# Altium footprint library 6-Connectors-2.PcbLib: 57 footprints (part 6 of 7)
Each footprint in its own frame and in the unit in brackets; x right, y up, seen from the top. Pads: shape width x height; smd on the part's side, far side on the other; paste and mask are expansions set on the pad; w line width, h text height; cw(c..) or ccw(c..) is an arc to the next point about the centre after c.
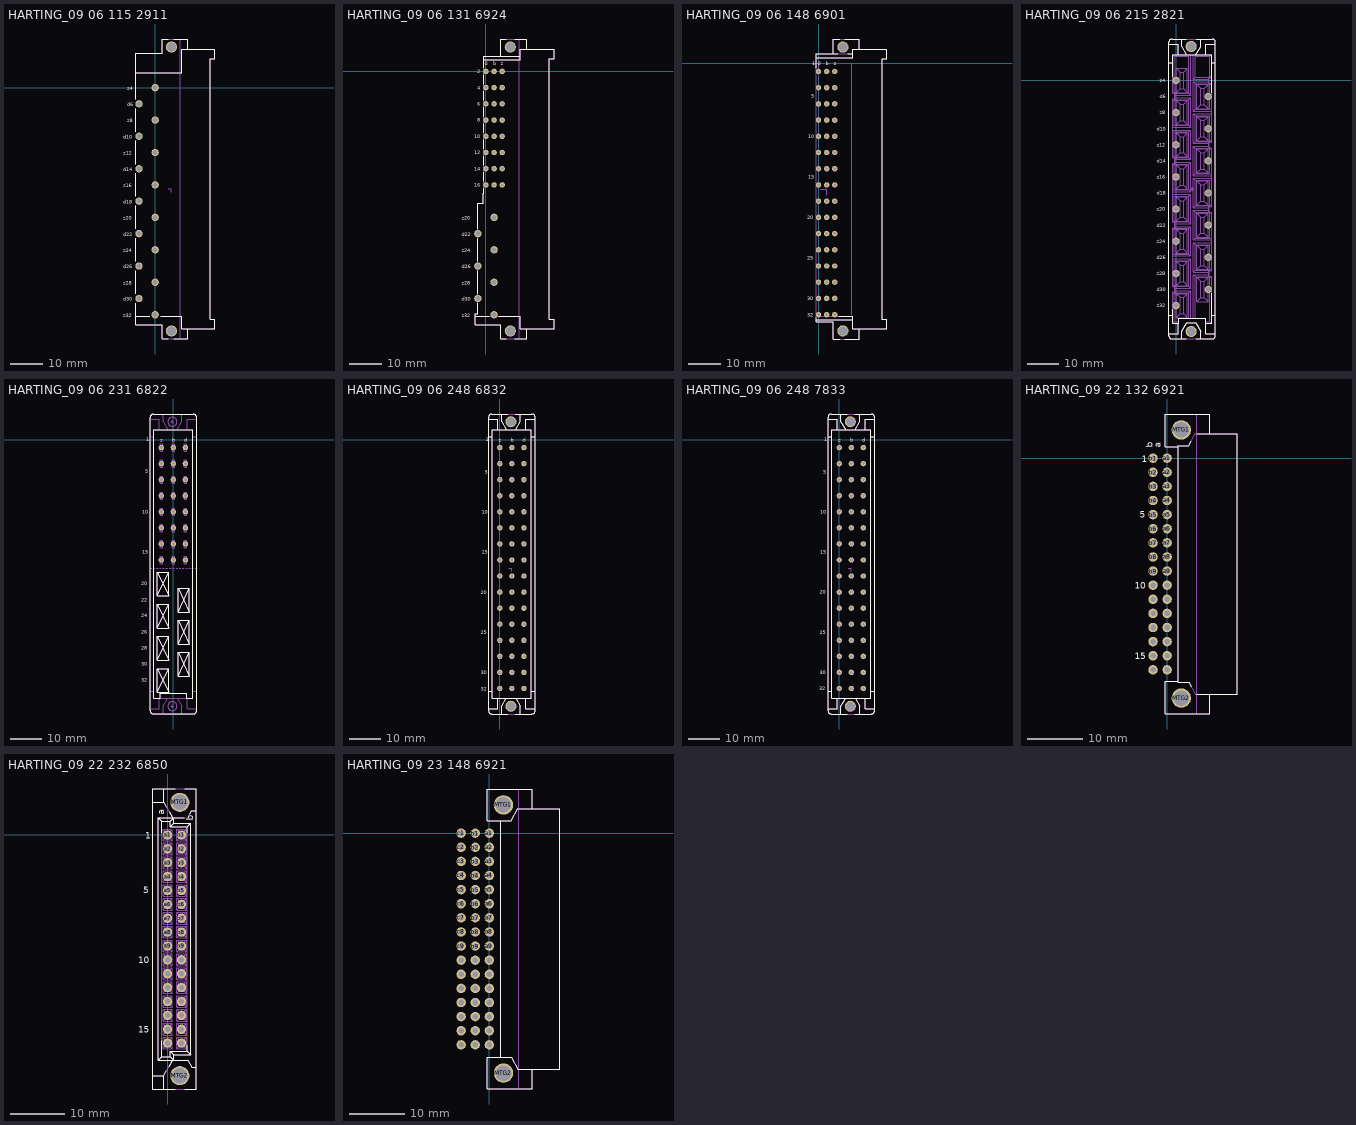
[diagram p5: the footprints below, top view; thin cyan lines are the x and y axes]

## HARTING_09 06 115 2911 [mm] "DIN 41612, Type H, 15 Poles, Rows z+d, Performance level 1, Right Angle Male Connector, Lead 3.0 mm, Pitch 5.08mm"
height 11
pads (17):
  round 2.3 hole 1.6: d6(-5.08,-5.08) d10(-5.08,-15.24) d14(-5.08,-25.4) d18(-5.08,-35.56) d22(-5.08,-45.72) d26(-5.08,-55.88) d30(-5.08,-66.04) z4(0,0) z8(0,-10.16) z12(0,-20.32) z16(0,-30.48) z20(0,-40.64) z24(0,-50.8) z28(0,-60.96) z32(0,-71.12)
  round 3.5 / inner round 3.5 / far side round 5.1 hole 2.8: MTG1(5.08,12.7) MTG2(5.08,-76.2)
Top Overlay:
  lines w0.2: -6.02,-71.55 -1.696,-71.55 ; -6.02,-67.516 -6.02,-74.3 2.18,-74.3 2.18,-78.725 4.14,-78.725 ; -6.02,-64.564 -6.02,-57.356 ; -6.02,-54.404 -6.02,-47.196 ; -6.02,-44.244 -6.02,-37.036 ; -6.02,-34.084 -6.02,-26.876 ; -6.02,-23.924 -6.02,-16.716 ; -6.02,-13.764 -6.02,-6.556 ; -6.02,-3.604 -6.02,10.8 2.18,10.8 2.18,15.225 4.14,15.225 ; -6.02,4.67 8.38,4.67 8.38,11.95 18.73,11.95 18.73,9.05 17.21,9.05 17.21,-72.55 18.73,-72.55 18.73,-75.45 8.38,-75.45 8.38,-71.55 1.696,-71.55 ; 5.765,-78.725 10.23,-78.725 10.23,-75.45 ; 5.765,15.225 10.23,15.225 10.23,11.95
  text "z32" at -10.07,-71.87 h1.2
  text "z28" at -10.07,-61.71 h1.2
  text "d30" at -10.07,-66.79 h1.2
  text "z24" at -10.07,-51.55 h1.2
  text "d26" at -10.07,-56.63 h1.2
  text "z20" at -10.07,-41.39 h1.2
  text "d22" at -10.07,-46.47 h1.2
  text "z16" at -10.07,-31.23 h1.2
  text "d18" at -10.07,-36.31 h1.2
  text "z12" at -10.07,-21.07 h1.2
  text "d14" at -10.07,-26.15 h1.2
  text "z8" at -8.8,-10.91 h1.2
  text "d10" at -10.07,-15.99 h1.2
  text "d6" at -8.8,-5.83 h1.2
  text "z4" at -8.8,-0.75 h1.2
Mechanical 8:
  lines w0.2: 4.064,-31.75 5.08,-31.75 5.08,-32.75 ; 7.84,-78.725 7.84,15.225
  text "PCB" at 6.985,-33.655 h1.2
Mechanical 14:
  lines w0.1: -6.02,-71.55 -1.696,-71.55 ; -6.02,-67.516 -6.02,-74.3 2.18,-74.3 2.18,-78.725 10.23,-78.725 10.23,-75.45 ; -6.02,-64.564 -6.02,-57.356 ; -6.02,-54.404 -6.02,-47.196 ; -6.02,-44.244 -6.02,-37.036 ; -6.02,-34.084 -6.02,-26.876 ; -6.02,-23.924 -6.02,-16.716 ; -6.02,-13.764 -6.02,-6.556 ; -6.02,-3.604 -6.02,10.8 2.18,10.8 2.18,15.225 10.23,15.225 10.23,11.95 ; -6.02,4.67 8.38,4.67 8.38,11.95 18.73,11.95 18.73,9.05 17.21,9.05 17.21,-72.55 18.73,-72.55 18.73,-75.45 8.38,-75.45 8.38,-71.55 1.696,-71.55
  text "z32" at -10.07,-71.87 h1.2
  text "z28" at -10.07,-61.71 h1.2
  text "d30" at -10.07,-66.79 h1.2
  text "z24" at -10.07,-51.55 h1.2
  text "d26" at -10.07,-56.63 h1.2
  text "z20" at -10.07,-41.39 h1.2
  text "d22" at -10.07,-46.47 h1.2
  text "z16" at -10.07,-31.23 h1.2
  text "d18" at -10.07,-36.31 h1.2
  text "z12" at -10.07,-21.07 h1.2
  text "d14" at -10.07,-26.15 h1.2
  text "z8" at -8.8,-10.91 h1.2
  text "d10" at -10.07,-15.99 h1.2
  text "d6" at -8.8,-5.83 h1.2
  text "z4" at -8.8,-0.75 h1.2
3D body "v240-170.stp": height 0.02, standoff -1.65, extent -6.28,-67.24 -3.88,-64.84
3D body "v240-170.stp": height 0.02, standoff -1.65, extent -1.2,-62.16 1.2,-59.76
3D body "v240-170.stp": height 0.02, standoff -1.65, extent -1.2,-72.32 1.2,-69.92
3D body "v240-170.stp": height 0.02, standoff -1.65, extent -1.2,-41.84 1.2,-39.44
3D body "v240-170.stp": height 0.02, standoff -1.65, extent -1.2,-52 1.2,-49.6
3D body "v240-170.stp": height 0.02, standoff -1.65, extent -6.28,-46.92 -3.88,-44.52
3D body "v240-170.stp": height 0.02, standoff -1.65, extent -6.28,-57.08 -3.88,-54.68
3D body "v240-170.stp": height 0.02, standoff -1.65, extent -1.2,-21.52 1.2,-19.12
3D body "v240-170.stp": height 0.02, standoff -1.65, extent -1.2,-31.68 1.2,-29.28
3D body "v240-170.stp": height 0.02, standoff -1.65, extent -6.28,-26.6 -3.88,-24.2
3D body "v240-170.stp": height 0.02, standoff -1.65, extent -6.28,-36.76 -3.88,-34.36
3D body "v240-170.stp": height 0.02, standoff -1.65, extent -1.2,-1.2 1.2,1.2
3D body "v240-170.stp": height 0.02, standoff -1.65, extent -1.2,-11.36 1.2,-8.96
3D body "v240-170.stp": height 0.02, standoff -1.65, extent -6.28,-6.28 -3.88,-3.88
3D body "v240-170.stp": height 0.02, standoff -1.65, extent -6.28,-16.44 -3.88,-14.04
3D body "v160-080.stp": height 0.02, standoff -1.65, extent -5.88,-16.04 -4.28,-14.44
3D body "v160-080.stp": height 0.02, standoff -1.65, extent -5.88,-5.88 -4.28,-4.28
3D body "HARTING_09 06 115 2911.stp": height 11.2, standoff -3.5, extent -6.02,-78.725 18.73,15.225

## HARTING_09 06 131 6924 [mm] "DIN 41612, Type MH, 24+ 7 Contacts, Rows z+b+d, Performance level 2, Right Angled Male Connector"
height 11.22
pads (33):
  round 1.7 hole 1: b2(2.54,0) b4(2.54,-5.08) b6(2.54,-10.16) b8(2.54,-15.24) b10(2.54,-20.32) b12(2.54,-25.4) b14(2.54,-30.48) b16(2.54,-35.56) d2(0,0) d4(0,-5.08) d6(0,-10.16) d8(0,-15.24) d10(0,-20.32) d12(0,-25.4) d14(0,-30.48) d16(0,-35.56) z2(5.08,0) z4(5.08,-5.08) z6(5.08,-10.16) z8(5.08,-15.24) z10(5.08,-20.32) z12(5.08,-25.4) z14(5.08,-30.48) z16(5.08,-35.56)
  round 2.3 hole 1.6: d22(-2.54,-50.8) d26(-2.54,-60.96) d30(-2.54,-71.12) z20(2.54,-45.72) z24(2.54,-55.88) z28(2.54,-66.04) z32(2.54,-76.2)
  round 3.5 / inner round 3.5 / far side round 5.1 hole 2.8: MTG1(7.62,7.62) MTG2(7.62,-81.28)
Top Overlay:
  lines w0.2: -3.43,-76.63 1.051,-76.63 ; -2.63,-72.667 -2.63,-75.83 -3.43,-75.83 -3.43,-79.36 4.67,-79.36 4.67,-83.805 6.325,-83.805 ; -2.63,-69.573 -2.63,-62.507 ; -2.63,-59.413 -2.63,-52.347 ; -2.63,-49.253 -2.63,-41.345 -0.83,-41.345 -0.83,-38.1 -0.68,-38.1 -0.68,-36.668 ; -0.68,-34.452 -0.68,-31.588 ; -0.68,-29.372 -0.68,-26.508 ; -0.68,-24.292 -0.68,-21.428 ; -0.68,-19.212 -0.68,-16.348 ; -0.68,-14.132 -0.68,-11.268 ; -0.68,-9.052 -0.68,-6.188 ; -0.68,-3.972 -0.68,-1.108 ; -0.68,1.108 -0.68,4.79 10.77,4.79 ; -0.68,3.62 10.77,3.62 10.77,6.87 21.32,6.87 21.32,3.97 19.82,3.97 19.82,-77.63 21.32,-77.63 21.32,-80.53 10.77,-80.53 ; 4.029,-76.63 10.77,-76.63 ; 4.67,4.79 4.67,10.145 6.325,10.145 ; 9.025,-83.805 12.77,-83.805 12.77,-80.53 ; 9.025,10.145 12.77,10.145 12.77,6.87 ; 10.77,-80.53 10.77,-76.63 ; 10.77,-80.53 10.77,-76.63
  text "d22" at -7.53,-51.55 h1.2
  text "z20" at -7.53,-46.47 h1.2
  text "d26" at -7.53,-61.71 h1.2
  text "z24" at -7.53,-56.63 h1.2
  text "d30" at -7.53,-71.87 h1.2
  text "z28" at -7.53,-66.79 h1.2
  text "z32" at -7.53,-76.95 h1.2
  text "b" at 2.223,1.905 h1.2
  text "2" at -2.765,-0.543 h1.2
  text "4" at -2.79,-5.685 h1.2
  text "z" at 4.608,1.905 h1.2
  text "d" at -0.318,1.905 h1.2
  text "6" at -2.79,-10.765 h1.2
  text "8" at -2.79,-15.845 h1.2
  text "10" at -3.74,-20.925 h1.2
  text "12" at -3.74,-26.005 h1.2
  text "14" at -3.74,-31.085 h1.2
  text "16" at -3.74,-36.165 h1.2
Mechanical 8:
  lines w0.1: -3.04,-71.12 -2.54,-71.12 ; -3.04,-60.96 -2.54,-60.96 ; -3.04,-50.8 -2.54,-50.8 ; -2.54,-71.62 -2.54,-71.12 ; -2.54,-70.62 -2.54,-71.12 ; -2.54,-61.46 -2.54,-60.96 ; -2.54,-60.46 -2.54,-60.96 ; -2.54,-51.3 -2.54,-50.8 ; -2.54,-50.3 -2.54,-50.8 ; -2.04,-71.12 -2.54,-71.12 ; -2.04,-60.96 -2.54,-60.96 ; -2.04,-50.8 -2.54,-50.8 ; -0.5,-35.56 0,-35.56 ; -0.5,-30.48 0,-30.48 ; -0.5,-25.4 0,-25.4 ; -0.5,-20.32 0,-20.32 ; -0.5,-15.24 0,-15.24 ; -0.5,-10.16 0,-10.16 ; -0.5,-5.08 0,-5.08 ; 0,-36.06 0,-35.56 ; 0,-35.06 0,-35.56 ; 0,-30.98 0,-30.48 ; 0,-29.98 0,-30.48 ; 0,-25.9 0,-25.4 ; 0,-24.9 0,-25.4 ; 0,-20.82 0,-20.32 ; 0,-19.82 0,-20.32 ; 0,-15.74 0,-15.24 ; 0,-14.74 0,-15.24 ; 0,-10.66 0,-10.16 ; 0,-9.66 0,-10.16 ; 0,-5.58 0,-5.08 ; 0,-4.58 0,-5.08 ; 0.5,-35.56 0,-35.56 ; 0.5,-30.48 0,-30.48 ; 0.5,-25.4 0,-25.4 ; 0.5,-20.32 0,-20.32 ; 0.5,-15.24 0,-15.24 ; 0.5,-10.16 0,-10.16 ; 0.5,-5.08 0,-5.08 ; 2.04,-76.2 2.54,-76.2 ; 2.04,-66.04 2.54,-66.04 ; 2.04,-55.88 2.54,-55.88 ; 2.04,-45.72 2.54,-45.72 ; 2.04,-35.56 2.54,-35.56 ; 2.04,-30.48 2.54,-30.48 ; 2.04,-25.4 2.54,-25.4 ; 2.04,-20.32 2.54,-20.32 ; 2.04,-15.24 2.54,-15.24 ; 2.04,-10.16 2.54,-10.16 ; 2.04,-5.08 2.54,-5.08 ; 2.04,0 2.54,0 ; 2.54,-76.7 2.54,-76.2 ; 2.54,-75.7 2.54,-76.2 ; 2.54,-66.54 2.54,-66.04 ; 2.54,-65.54 2.54,-66.04 ; 2.54,-56.38 2.54,-55.88 ; 2.54,-55.38 2.54,-55.88 ; 2.54,-46.22 2.54,-45.72 ; 2.54,-45.22 2.54,-45.72 ; 2.54,-36.06 2.54,-35.56 ; 2.54,-35.06 2.54,-35.56 ; 2.54,-30.98 2.54,-30.48 ; 2.54,-29.98 2.54,-30.48 ; 2.54,-25.9 2.54,-25.4 ; 2.54,-24.9 2.54,-25.4 ; 2.54,-20.82 2.54,-20.32 ; 2.54,-19.82 2.54,-20.32 ; 2.54,-15.74 2.54,-15.24 ; 2.54,-14.74 2.54,-15.24 ; 2.54,-10.66 2.54,-10.16 ; 2.54,-9.66 2.54,-10.16 ; 2.54,-5.58 2.54,-5.08 ; 2.54,-4.58 2.54,-5.08 ; 2.54,-0.5 2.54,0 ; 2.54,0.5 2.54,0 ; 3.04,-76.2 2.54,-76.2 ; 3.04,-66.04 2.54,-66.04 ; 3.04,-55.88 2.54,-55.88 ; 3.04,-45.72 2.54,-45.72 ; 3.04,-35.56 2.54,-35.56 ; 3.04,-30.48 2.54,-30.48 ; 3.04,-25.4 2.54,-25.4 ; 3.04,-20.32 2.54,-20.32 ; 3.04,-15.24 2.54,-15.24 ; 3.04,-10.16 2.54,-10.16 ; 3.04,-5.08 2.54,-5.08 ; 3.04,0 2.54,0 ; 4.58,-35.56 5.08,-35.56 ; 4.58,-30.48 5.08,-30.48 ; 4.58,-25.4 5.08,-25.4 ; 4.58,-20.32 5.08,-20.32 ; 4.58,-15.24 5.08,-15.24 ; 4.58,-10.16 5.08,-10.16 ; 4.58,-5.08 5.08,-5.08 ; 4.58,0 5.08,0 ; 5.08,-36.06 5.08,-35.56 ; 5.08,-35.06 5.08,-35.56 ; 5.08,-30.98 5.08,-30.48 ; 5.08,-29.98 5.08,-30.48 ; 5.08,-25.9 5.08,-25.4 ; 5.08,-24.9 5.08,-25.4 ; 5.08,-20.82 5.08,-20.32 ; 5.08,-19.82 5.08,-20.32 ; 5.08,-15.74 5.08,-15.24 ; 5.08,-14.74 5.08,-15.24 ; 5.08,-10.66 5.08,-10.16 ; 5.08,-9.66 5.08,-10.16 ; 5.08,-5.58 5.08,-5.08 ; 5.08,-4.58 5.08,-5.08 ; 5.08,-0.5 5.08,0 ; 5.08,0.5 5.08,0 ; 5.58,-35.56 5.08,-35.56 ; 5.58,-30.48 5.08,-30.48 ; 5.58,-25.4 5.08,-25.4 ; 5.58,-20.32 5.08,-20.32 ; 5.58,-15.24 5.08,-15.24 ; 5.58,-10.16 5.08,-10.16 ; 5.58,-5.08 5.08,-5.08 ; 5.58,0 5.08,0 ; 7.12,-81.28 7.62,-81.28 ; 7.12,7.62 7.62,7.62 ; 7.62,-81.78 7.62,-81.28 ; 7.62,-80.78 7.62,-81.28 ; 7.62,7.12 7.62,7.62 ; 7.62,8.12 7.62,7.62 ; 8.12,-81.28 7.62,-81.28 ; 8.12,7.62 7.62,7.62 ; 10.38,-83.805 10.38,-36.83 10.38,10.145 ; 0,0 0,-0.5 0,0 ; 0,0 -0.5,0 0,0 ; 0,0 0,0.5 0,0 ; 0,0 0.5,0 0,0
  text "PCB Edge" at 9.525,-38.735 h1.2
Mechanical 14:
  circle w0.1: c7.62,7.62 r1.29
  circle w0.1: c7.62,-81.28 r1.29
  lines w0.1: -3.43,-76.63 10.77,-76.63 ; -0.68,3.62 10.77,3.62 10.77,6.87 21.32,6.87 21.32,3.97 19.82,3.97 19.82,-77.63 21.32,-77.63 21.32,-80.53 10.77,-80.53 ; 4.67,4.79 4.67,10.145 12.77,10.145 12.77,6.87 ; 10.77,4.79 -0.68,4.79 -0.68,-38.1 -0.83,-38.1 -0.83,-41.345 -2.63,-41.345 -2.63,-75.83 -3.43,-75.83 -3.43,-79.36 4.67,-79.36 4.67,-83.805 12.77,-83.805 12.77,-80.53 ; 10.77,-80.53 10.77,-76.63 ; 10.77,-80.53 10.77,-76.63
  text "d22" at -7.53,-51.55 h1.2
  text "z20" at -7.53,-46.47 h1.2
  text "d26" at -7.53,-61.71 h1.2
  text "z24" at -7.53,-56.63 h1.2
  text "d30" at -7.53,-71.87 h1.2
  text "z28" at -7.53,-66.79 h1.2
  text "z32" at -7.53,-76.95 h1.2
  text "b" at 2.223,1.905 h1.2
  text "2" at -2.765,-0.543 h1.2
  text "4" at -2.79,-5.685 h1.2
  text "z" at 4.608,1.905 h1.2
  text "d" at -0.318,1.905 h1.2
  text "6" at -2.79,-10.765 h1.2
  text "8" at -2.79,-15.845 h1.2
  text "10" at -3.74,-20.925 h1.2
  text "12" at -3.74,-26.005 h1.2
  text "14" at -3.74,-31.085 h1.2
  text "16" at -3.74,-36.165 h1.2
3D body "HARTING_09 06 131 6924.stp": height 11.22, standoff -3.48, extent -3.43,-83.805 21.32,10.145

## HARTING_09 06 148 6901 [mm] "DIN 41612, Type F, 48 Contacts, Rows z+b+d, Performance level 2, Right Angle Male Connector"
height 10.1
pads (50):
  round 1.7 hole 1: b2(2.54,-2.54) b4(2.54,-7.62) b6(2.54,-12.7) b8(2.54,-17.78) b10(2.54,-22.86) b12(2.54,-27.94) b14(2.54,-33.02) b16(2.54,-38.1) b18(2.54,-43.18) b20(2.54,-48.26) b22(2.54,-53.34) b24(2.54,-58.42) b26(2.54,-63.5) b28(2.54,-68.58) b30(2.54,-73.66) b32(2.54,-78.74) d2(0,-2.54) d4(0,-7.62) d6(0,-12.7) d8(0,-17.78) d10(0,-22.86) d12(0,-27.94) d14(0,-33.02) d16(0,-38.1) d18(0,-43.18) d20(0,-48.26) d22(0,-53.34) d24(0,-58.42) d26(0,-63.5) d28(0,-68.58) d30(0,-73.66) d32(0,-78.74) z2(5.08,-2.54) z4(5.08,-7.62) z6(5.08,-12.7) z8(5.08,-17.78) z10(5.08,-22.86) z12(5.08,-27.94) z14(5.08,-33.02) z16(5.08,-38.1) z18(5.08,-43.18) z20(5.08,-48.26) z22(5.08,-53.34) z24(5.08,-58.42) z26(5.08,-63.5) z28(5.08,-68.58) z30(5.08,-73.66) z32(5.08,-78.74)
  round 3.5 / inner round 3.5 / far side round 5.1 hole 2.8: MTG1(7.62,5.08) MTG2(7.62,-83.82)
Top Overlay:
  lines w0.2: -0.78,-80.29 10.8,-80.29 ; -0.78,-79.742 -0.78,-80.97 4.67,-80.97 4.67,-86.37 6.63,-86.37 ; -0.78,-1.538 -0.78,2.95 6,2.95 ; -0.78,1.83 10.8,1.83 10.8,4.38 21.32,4.38 21.32,1.48 19.82,1.48 19.82,-80.22 21.32,-80.22 21.32,-83.12 10.8,-83.12 10.8,-79.17 6.275,-79.17 ; 4.67,2.95 4.67,7.63 6.63,7.63 ; 8.255,-86.37 12.72,-86.37 ; 8.255,7.63 12.72,7.63 ; 9.2,2.95 10.8,2.95 ; 12.77,-86.37 12.77,-83.12 ; 12.77,4.38 12.77,7.63
  text "d" at -0.318,-0.635 h1.2
  text "1" at -1.89,-0.635 h1.2
  text "z" at 4.763,-0.635 h1.2
  text "b" at 2.222,-0.635 h1.2
  text "32" at -3.477,-79.375 h1.2
  text "10" at -3.16,-23.495 h1.2
  text "15" at -3.16,-36.195 h1.2
  text "20" at -3.477,-48.895 h1.2
  text "25" at -3.477,-61.595 h1.2
  text "30" at -3.477,-74.295 h1.2
  text "5" at -2.207,-10.795 h1.2
Mechanical 8:
  lines w0.1: -2,0 0,0 0,-2 ; -0.78,-77.738 -0.78,-74.662 ; -0.78,-72.658 -0.78,-69.582 ; -0.78,-67.578 -0.78,-64.502 ; -0.78,-62.498 -0.78,-59.422 ; -0.78,-57.418 -0.78,-54.355 ; -0.78,-52.326 -0.78,-49.262 ; -0.78,-47.258 -0.78,-44.182 ; -0.78,-42.178 -0.78,-39.102 ; -0.78,-37.098 -0.78,-34.022 ; -0.78,-32.018 -0.78,-28.942 ; -0.78,-26.938 -0.78,-23.862 ; -0.78,-21.858 -0.78,-18.782 ; -0.78,-16.778 -0.78,-13.702 ; -0.78,-11.698 -0.78,-8.622 ; -0.78,-6.618 -0.78,-3.542 ; 0.54,-39.37 2.54,-39.37 2.54,-41.37 ; 10.38,-78.74 10.38,0
Mechanical 14:
  lines w0.1: -0.78,-80.29 10.8,-80.29 ; -0.78,-79.17 10.8,-79.17 10.8,-83.12 21.32,-83.12 21.32,-80.22 19.82,-80.22 19.82,1.48 21.32,1.48 21.32,4.38 10.8,4.38 10.8,1.83 -0.78,1.83 ; 4.67,2.95 4.67,7.63 12.77,7.63 12.77,4.38 ; 10.8,2.95 -0.78,2.95 -0.78,-80.97 4.67,-80.97 4.67,-86.37 12.77,-86.37 12.77,-83.12
  text "5" at -2.207,-10.795 h1.2
  text "30" at -3.477,-74.295 h1.2
  text "25" at -3.477,-61.595 h1.2
  text "20" at -3.477,-48.895 h1.2
  text "15" at -3.16,-36.195 h1.2
  text "10" at -3.16,-23.495 h1.2
  text "32" at -3.477,-79.375 h1.2
  text "1" at -1.89,-0.635 h1.2
3D body "HARTING_09 06 148 6901.stp": height 11.25, standoff -3.55, extent -0.78,-86.37 21.32,7.63

## HARTING_09 06 215 2821 [mm] "DIN 41612, Type H, 15 Poles, Rows z+d, Performance level 1, Low Profile Straight Female Connector, Lead 4.0 mm, Pitch 5.08mm"
height 10.1
pads (17):
  round 2.3 hole 1.6: d6(10.16,-5.08) d10(10.16,-15.24) d14(10.16,-25.4) d18(10.16,-35.56) d22(10.16,-45.72) d26(10.16,-55.88) d30(10.16,-66.04) z4(0,0) z8(0,-10.16) z12(0,-20.32) z16(0,-30.48) z20(0,-40.64) z24(0,-50.8) z28(0,-60.96) z32(0,-71.12)
  round 3.5 / inner round 3.5 / far side round 5.1 hole 2.8: MTG1(4.78,10.71) MTG2(4.78,-79.29)
Top Overlay:
  lines w0.2: -1.105,-74.24 -2.27,-74.24 ; -1.105,-72.277 -1.105,-76.7 0.855,-76.7 0.855,-76.15 0.855,-75.13 9.305,-75.13 9.305,-76.15 9.305,-76.7 11.265,-76.7 11.265,-67.197 ; -1.105,1.157 -1.105,8.12 11.265,8.12 11.265,-3.923 ; -1.105,5.66 -2.27,5.66 ; 0.705,-76.7 0.705,-80.04 -2.27,-80.04 ; 0.705,8.12 0.705,11.46 -2.27,11.46 ; 3.175,-81.665 1.805,-81.665 ; 3.175,13.085 1.805,13.085 ; 3.3,8.12 1.805,10.71 1.805,13.085 ; 6.26,8.12 7.755,10.71 7.755,13.085 ; 6.385,-81.665 7.755,-81.665 ; 6.385,13.085 7.755,13.085 ; 9.455,-76.7 9.455,-80.04 12.43,-80.04 ; 9.455,8.12 9.455,11.46 12.43,11.46 ; 11.265,-74.24 12.43,-74.24 ; 11.265,5.66 12.43,5.66 ; -2.27,-80.04 -2.27,-74.24 ; -2.27,-80.04 -2.27,-80.665 ccw(c-1.27,-80.665) -1.27,-81.665 1.805,-81.665 ; -2.27,-74.24 -2.27,5.66 ; -2.27,5.66 -2.27,11.46 ; -2.27,11.46 -2.27,12.085 cw(c-1.27,12.085) -1.27,13.085 1.805,13.085 ; 1.805,-81.665 1.805,-79.29 3.378,-76.565 6.182,-76.565 7.755,-79.29 7.755,-81.665 ; 7.755,-81.665 11.43,-81.665 ccw(c11.43,-80.665) 12.43,-80.665 12.43,-80.04 ; 7.755,13.085 11.43,13.085 cw(c11.43,12.085) 12.43,12.085 12.43,11.46 ; 12.43,-80.04 12.43,-74.24 ; 12.43,-74.24 12.43,5.66 ; 12.43,5.66 12.43,11.46
  text "z32" at -6.02,-71.695 h1.2
  text "z28" at -6.02,-61.535 h1.2
  text "d30" at -6.02,-66.615 h1.2
  text "z24" at -6.02,-51.375 h1.2
  text "d26" at -6.145,-56.455 h1.2
  text "z20" at -6.02,-41.215 h1.2
  text "d22" at -6.02,-46.295 h1.2
  text "z16" at -6.02,-31.055 h1.2
  text "d18" at -6.02,-36.135 h1.2
  text "z12" at -6.02,-20.895 h1.2
  text "d14" at -6.02,-25.975 h1.2
  text "z8" at -5.125,-10.685 h1.2
  text "d10" at -6.02,-15.815 h1.2
  text "d6" at -5.125,-5.605 h1.2
  text "z4" at -5.125,-0.525 h1.2
Mechanical 8:
  lines w0.1: -0.5,-71.12 0,-71.12 ; -0.5,-60.96 0,-60.96 ; -0.5,-50.8 0,-50.8 ; -0.5,-40.64 0,-40.64 ; -0.5,-30.48 0,-30.48 ; -0.5,-20.32 0,-20.32 ; -0.5,-10.16 0,-10.16 ; -0.5,0 0,0 ; 0,-71.62 0,-71.12 ; 0,-70.62 0,-71.12 ; 0,-61.46 0,-60.96 ; 0,-60.46 0,-60.96 ; 0,-51.3 0,-50.8 ; 0,-50.3 0,-50.8 ; 0,-41.14 0,-40.64 ; 0,-40.14 0,-40.64 ; 0,-30.98 0,-30.48 ; 0,-29.98 0,-30.48 ; 0,-20.82 0,-20.32 ; 0,-19.82 0,-20.32 ; 0,-10.66 0,-10.16 ; 0,-9.66 0,-10.16 ; 0,-0.5 0,0 ; 0,0.5 0,0 ; 0.5,-71.12 0,-71.12 ; 0.5,-60.96 0,-60.96 ; 0.5,-50.8 0,-50.8 ; 0.5,-40.64 0,-40.64 ; 0.5,-30.48 0,-30.48 ; 0.5,-20.32 0,-20.32 ; 0.5,-10.16 0,-10.16 ; 0.5,0 0,0 ; 4.28,-79.29 4.78,-79.29 ; 4.28,10.71 4.78,10.71 ; 4.78,-79.79 4.78,-79.29 ; 4.78,-78.79 4.78,-79.29 ; 4.78,10.21 4.78,10.71 ; 4.78,11.21 4.78,10.71 ; 5.28,-79.29 4.78,-79.29 ; 5.28,10.71 4.78,10.71 ; 9.66,-66.04 10.16,-66.04 ; 9.66,-55.88 10.16,-55.88 ; 9.66,-45.72 10.16,-45.72 ; 9.66,-35.56 10.16,-35.56 ; 9.66,-25.4 10.16,-25.4 ; 9.66,-15.24 10.16,-15.24 ; 9.66,-5.08 10.16,-5.08 ; 10.16,-66.54 10.16,-66.04 ; 10.16,-65.54 10.16,-66.04 ; 10.16,-56.38 10.16,-55.88 ; 10.16,-55.38 10.16,-55.88 ; 10.16,-46.22 10.16,-45.72 ; 10.16,-45.22 10.16,-45.72 ; 10.16,-36.06 10.16,-35.56 ; 10.16,-35.06 10.16,-35.56 ; 10.16,-25.9 10.16,-25.4 ; 10.16,-24.9 10.16,-25.4 ; 10.16,-15.74 10.16,-15.24 ; 10.16,-14.74 10.16,-15.24 ; 10.16,-5.58 10.16,-5.08 ; 10.16,-4.58 10.16,-5.08 ; 10.66,-66.04 10.16,-66.04 ; 10.66,-55.88 10.16,-55.88 ; 10.66,-45.72 10.16,-45.72 ; 10.66,-35.56 10.16,-35.56 ; 10.66,-25.4 10.16,-25.4 ; 10.66,-15.24 10.16,-15.24 ; 10.66,-5.08 10.16,-5.08 ; 5.08,-34.29 4.58,-34.29 5.08,-34.29 ; 5.08,-34.29 5.08,-34.79 5.08,-34.29 ; 5.08,-34.29 5.58,-34.29 5.08,-34.29 ; 5.08,-34.29 5.08,-33.79 5.08,-34.29
Mechanical 14:
  drawing of 585 lines, arcs and shapes, not listed
  text "z4" at -5.125,-0.525 h1.2
  text "d6" at -5.125,-5.605 h1.2
  text "d10" at -6.02,-15.815 h1.2
  text "z8" at -5.125,-10.685 h1.2
  text "d14" at -6.02,-25.975 h1.2
  text "z12" at -6.02,-20.895 h1.2
  text "d18" at -6.02,-36.135 h1.2
  text "z16" at -6.02,-31.055 h1.2
  text "d22" at -6.02,-46.295 h1.2
  text "z20" at -6.02,-41.215 h1.2
  text "d26" at -6.145,-56.455 h1.2
  text "z24" at -6.02,-51.375 h1.2
  text "d30" at -6.02,-66.615 h1.2
  text "z28" at -6.02,-61.535 h1.2
  text "z32" at -6.02,-71.695 h1.2
  text "z4" at -5.125,-0.525 h1.2
  text "d6" at -5.125,-5.605 h1.2
  text "d10" at -6.02,-15.815 h1.2
  text "z8" at -5.125,-10.685 h1.2
  text "d14" at -6.02,-25.975 h1.2
  text "z12" at -6.02,-20.895 h1.2
  text "d18" at -6.02,-36.135 h1.2
  text "z16" at -6.02,-31.055 h1.2
  text "d22" at -6.02,-46.295 h1.2
  text "z20" at -6.02,-41.215 h1.2
  text "d26" at -6.145,-56.455 h1.2
  text "z24" at -6.02,-51.375 h1.2
  text "d30" at -6.02,-66.615 h1.2
  text "z28" at -6.02,-61.535 h1.2
  text "z32" at -6.02,-71.695 h1.2
  text "z32" at -6.02,-71.695 h1.2
  text "z28" at -6.02,-61.535 h1.2
  text "d30" at -6.02,-66.615 h1.2
  text "z24" at -6.02,-51.375 h1.2
  text "d26" at -6.145,-56.455 h1.2
  text "z20" at -6.02,-41.215 h1.2
  text "d22" at -6.02,-46.295 h1.2
  text "z16" at -6.02,-31.055 h1.2
  text "d18" at -6.02,-36.135 h1.2
  text "z12" at -6.02,-20.895 h1.2
  text "d14" at -6.02,-25.975 h1.2
  text "z8" at -5.125,-10.685 h1.2
  text "d10" at -6.02,-15.815 h1.2
  text "d6" at -5.125,-5.605 h1.2
  text "z4" at -5.125,-0.525 h1.2
3D body "HARTING_09 06 215 2821.stp": height 10.1, standoff -4, extent -2.27,-81.665 12.43,13.085
